# Altium footprint library Nhat_Lib.PcbLib: 84 footprints (part 6 of 6)
Each footprint in its own frame and in the unit in brackets; x right, y up, seen from the top. Pads: shape width x height; smd on the part's side, far side on the other; paste and mask are expansions set on the pad; w line width, h text height; cw(c..) or ccw(c..) is an arc to the next point about the centre after c.
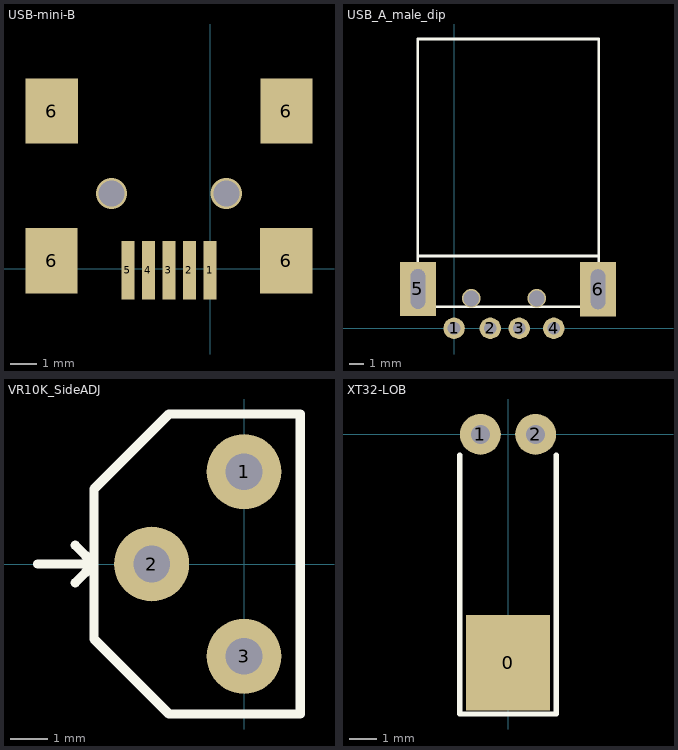
[diagram p5: the footprints below, top view; thin cyan lines are the x and y axes]

## USB-mini-B [mm]
pads (9):
  rect 0.5x2.25 smd: 1(0,-0.051) 2(-0.787,-0.051) 3(-1.575,-0.051) 4(-2.362,-0.051) 5(-3.15,-0.051)
  rect 2x2.5 smd: 6(-6.075,0.305) 6(-6.071,6.045) 6(2.925,0.305) 6(2.929,6.045)
via 0.625,2.885 diameter 1.2 hole 1
via -3.775,2.885 diameter 1.2 hole 1
3D body: height 3.95, standoff -1, extent -6.925,-0.368 3.775,8.832

## USB_A_male_dip [mm]
pads (6):
  round 1.5 hole 0.9: 1(0,0) 2(2.54,0) 3(4.572,0) 4(7,0)
  rect 2.54x3.81 hole 1.016 slot 2.794 at 90 deg: 5(-2.54,2.769) 6(10.109,2.743)
via 1.2,2.1 diameter 1.3 hole 1.1
via 5.8,2.1 diameter 1.3 hole 1.1
Top Overlay:
  lines w0.178: -2.54,5.08 10.16,5.08 ; -2.54,1.524 -2.54,20.32 10.16,20.32 10.16,1.524 -2.54,1.524

## VR10K_SideADJ [mm]
pads (3):
  round 2.032 hole 1: 1(0,2.5) 2(-2.5,0) 3(0,-2.5)
Top Overlay:
  lines w0.254: -5.588,0 -5.08,0 -4.064,0 ; -4.572,-0.508 -4.064,0 ; -4.572,0.508 -4.064,0 ; -4.064,-2.032 -2.032,-4.064 1.524,-4.064 1.524,4.064 -2.032,4.064 -4.064,2.032 -4.064,-2.032

## XT32-LOB [mm] "Crystal 32K, cylinder, lie on board"
pads (3):
  rect 3.1x3.5 smd: 0(0,-8.4)
  round 1.5 hole 0.7: 1(-1.016,0) 2(1.016,0)
Top Overlay:
  lines w0.2: -1.778,-0.762 -1.778,-10.287 1.778,-10.287 1.778,-0.762
3D body: height 3.1, standoff 0, extent -1.564,-9.561 1.524,-1.361